# Altium schematic symbol library Capacitor - Aluminium TH.SchLib: 4591 symbols (part 1 of 27) (continued)
## 16ZLS2200MEFC12.5X20 (continued)
CAP ALUM 2200UF 20% 16V RADIAL; Part Number: 16ZLS2200MEFC12.5X20; Manufacturer: Rubycon; TemperatureRange: -40C ~ 105C; Type: Polar; Ripple Current: 1.736A; Impedance: 17 mOhm; Value: 2200uF; PartId: 23373; Supplier 1: Digi-Key; Supplier Part Number 1: 1189-2578-ND; ComponentLink1Description: Datasheet; ComponentLink1URL: http://www.rubycon.co.jp/en/catalog/e_pdfs/aluminum/e_zls.pdf; ComponentLink2Description: Digi-Key Listing; ComponentLink2URL: https://www.digikey.com/product-detail/en/rubycon/16ZLS2200MEFC12.5X20/1189-2578-ND/4977125; Tolerance: 20%; Voltage: 16V; Price: 0.9; Device Package: Radial, Can, 12.5mm
footprint CAP AL TH D12.5 L5 H22
pins: 1, 2

## 16ZLS2700MEFC12.5X25
designator C?, comment 2700uF  (value not drawn)
CAP ALUM 2700UF 20% 16V RADIAL; Part Number: 16ZLS2700MEFC12.5X25; Manufacturer: Rubycon; TemperatureRange: -40C ~ 105C; Type: Polar; Ripple Current: 2.03A; Impedance: 15 mOhm; Value: 2700uF; PartId: 23980; Supplier 1: Digi-Key; Supplier Part Number 1: 1189-2579-ND; ComponentLink1Description: Datasheet; ComponentLink1URL: http://www.rubycon.co.jp/en/catalog/e_pdfs/aluminum/e_zls.pdf; ComponentLink2Description: Digi-Key Listing; ComponentLink2URL: https://www.digikey.com/product-detail/en/rubycon/16ZLS2700MEFC12.5X25/1189-2579-ND/4977126; Tolerance: 20%; Voltage: 16V; Price: 1.03; Device Package: Radial, Can, 12.5mm
footprint CAP AL TH D12.5 L5 H27
pins: 1, 2

## 16ZLS3300MEFC12.5X30
designator C?, comment 3300uF  (value not drawn)
CAP ALUM 3300UF 20% 16V RADIAL; Part Number: 16ZLS3300MEFC12.5X30; Manufacturer: Rubycon; TemperatureRange: -40C ~ 105C; Type: Polar; Ripple Current: 2.415A; Impedance: 13 mOhm; Value: 3300uF; PartId: 24295; Supplier 1: Digi-Key; Supplier Part Number 1: 1189-2580-ND; ComponentLink1Description: Datasheet; ComponentLink1URL: http://www.rubycon.co.jp/en/catalog/e_pdfs/aluminum/e_zls.pdf; ComponentLink2Description: Digi-Key Listing; ComponentLink2URL: https://www.digikey.com/product-detail/en/rubycon/16ZLS3300MEFC12.5X30/1189-2580-ND/4977127; Tolerance: 20%; Voltage: 16V; Price: 1.16; Device Package: Radial, Can, 12.5mm
footprint CAP AL TH D12.5 L5 H35.5
pins: 1, 2

## 25PK680MEFC10X12.5
designator C?, comment 680uF  (value not drawn)
CAP ALUM 680UF 20% 25V RADIAL; Part Number: 25PK680MEFC10X12.5; Manufacturer: Rubycon; TemperatureRange: -40C ~ 85C; Ripple Current: 780mA; Value: 680uF; PartId: 24905; Supplier 1: Digi-Key; Supplier Part Number 1: 1189-1222-ND; ComponentLink1Description: Datasheet; ComponentLink1URL: http://www.rubycon.co.jp/en/catalog/e_pdfs/aluminum/e_pk.pdf; ComponentLink2Description: Digi-Key Listing; ComponentLink2URL: https://www.digikey.com/product-detail/en/rubycon/25PK680MEFC10X12.5/1189-1222-ND/3134178; Tolerance: 20%; Voltage: 25V; Price: 0.49; Device Package: Radial, Can, 10mm
footprint CAP AL TH D10 L5 H14.5
pins: 1, 2

## 25PK1000MEFC10X16
designator C?, comment 1000uF  (value not drawn)
CAP ALUM 1000UF 20% 25V RADIAL; Part Number: 25PK1000MEFC10X16; Manufacturer: Rubycon; TemperatureRange: -40C ~ 85C; Ripple Current: 870mA; Value: 1000uF; PartId: 25213; Supplier 1: Digi-Key; Supplier Part Number 1: 1189-1217-ND; ComponentLink1Description: Datasheet; ComponentLink1URL: http://www.rubycon.co.jp/en/catalog/e_pdfs/aluminum/e_pk.pdf; ComponentLink2Description: Digi-Key Listing; ComponentLink2URL: https://www.digikey.com/product-detail/en/rubycon/25PK1000MEFC10X16/1189-1217-ND/3134173; Tolerance: 20%; Voltage: 25V; Price: 0.52; Device Package: Radial, Can, 10mm
footprint CAP AL TH D10 L5 H17.5
pins: 1, 2

## 25PK2200MEFC12.5X20
designator C?, comment 2200uF  (value not drawn)
CAP ALUM 2200UF 20% 25V RADIAL; Part Number: 25PK2200MEFC12.5X20; Manufacturer: Rubycon; TemperatureRange: -40C ~ 85C; Ripple Current: 1.5A; Value: 2200uF; PartId: 22956; Supplier 1: Digi-Key; Supplier Part Number 1: 1189-1731-ND; ComponentLink1Description: Datasheet; ComponentLink1URL: http://www.rubycon.co.jp/en/catalog/e_pdfs/aluminum/e_pk.pdf; ComponentLink2Description: Digi-Key Listing; ComponentLink2URL: https://www.digikey.com/product-detail/en/rubycon/25PK2200MEFC12.5X20/1189-1731-ND/3564008; Tolerance: 20%; Voltage: 25V; Price: 0; Device Package: Radial, Can, 12.5mm
footprint CAP AL TH D12.5 L5 H21.5
pins: 1, 2

## 25PX680MEFC10X12.5
designator C?, comment 680uF  (value not drawn)
CAP ALUM 680UF 20% 25V RADIAL; Part Number: 25PX680MEFC10X12.5; Manufacturer: Rubycon; TemperatureRange: -55C ~ 105C; Type: Polar; Ripple Current: 630mA; Value: 680uF; PartId: 24799; Supplier 1: Digi-Key; Supplier Part Number 1: 1189-1229-ND; ComponentLink1Description: Datasheet; ComponentLink1URL: http://www.rubycon.co.jp/en/catalog/e_pdfs/aluminum/e_px.pdf; ComponentLink2Description: Digi-Key Listing; ComponentLink2URL: https://www.digikey.com/product-detail/en/rubycon/25PX680MEFC10X12.5/1189-1229-ND/3134185; Tolerance: 20%; Voltage: 25V; Price: 0.45; Device Package: Radial, Can, 10mm
footprint CAP AL TH D10 L5 H14.5
pins: 1, 2

## 25PX1000MEFC10X16
designator C?, comment 1000uF  (value not drawn)
CAP ALUM 1000UF 20% 25V RADIAL; Part Number: 25PX1000MEFC10X16; Manufacturer: Rubycon; TemperatureRange: -55C ~ 105C; Type: Polar; Ripple Current: 740mA @ 120Hz; Value: 1000uF; PartId: 25377; Supplier 1: Digi-Key; Supplier Part Number 1: 1189-3681-ND; ComponentLink1Description: Datasheet; ComponentLink1URL: http://www.rubycon.co.jp/en/catalog/e_pdfs/aluminum/e_px.pdf; ComponentLink2Description: Digi-Key Listing; ComponentLink2URL: https://www.digikey.com/product-detail/en/rubycon/25PX1000MEFC10X16/1189-3681-ND/3563675; Tolerance: 20%; Voltage: 25V; Price: 0.73; Device Package: Radial, Can, 10mm
footprint CAP AL TH D10 L5 H17.5
pins: 1, 2

## 25PX1000MEFCT810X16
designator C?, comment 1000uF  (value not drawn)
CAP ALUM 1000UF 20% 25V RADIAL; Part Number: 25PX1000MEFCT810X16; Manufacturer: Rubycon; TemperatureRange: -55C ~ 105C; Type: Polar; Ripple Current: 740mA; Value: 1000uF; PartId: 25044; Supplier 1: Digi-Key; Supplier Part Number 1: 1189-1583-3-ND; ComponentLink1Description: Datasheet; ComponentLink1URL: http://www.rubycon.co.jp/en/catalog/e_pdfs/aluminum/e_px.pdf; ComponentLink2Description: Digi-Key Listing; ComponentLink2URL: https://www.digikey.com/product-detail/en/rubycon/25PX1000MEFCT810X16/1189-1583-3-ND/3134863; Tolerance: 20%; Voltage: 25V; Price: 0.1922; Device Package: Radial, Can, 10mm
footprint CAP AL TH D10 L5 H17.5
pins: 1, 2

## 25PX6800MEFC16X31.5
designator C?, comment 6800uF  (value not drawn)
CAP ALUM 6800UF 20% 25V RADIAL; Part Number: 25PX6800MEFC16X31.5; Manufacturer: Rubycon; TemperatureRange: -55C ~ 105C; Type: Polar; Ripple Current: 1.91A; Value: 6800uF; PartId: 27157; Supplier 1: Digi-Key; Supplier Part Number 1: 1189-1706-ND; ComponentLink1Description: Datasheet; ComponentLink1URL: http://www.rubycon.co.jp/en/catalog/e_pdfs/aluminum/e_px.pdf; ComponentLink2Description: Digi-Key Listing; ComponentLink2URL: https://www.digikey.com/product-detail/en/rubycon/25PX6800MEFC16X31.5/1189-1706-ND/3621620; Tolerance: 20%; Voltage: 25V; Price: 1.87; Device Package: Radial, Can, 16mm
footprint CAP AL TH D16 L7.5 H33.5
pins: 1, 2

## 25WA470MEFC10X9
designator C?, comment 470uF  (value not drawn)
CAP ALUM 470UF 20% 25V RADIAL; Part Number: 25WA470MEFC10X9; Manufacturer: Rubycon; TemperatureRange: -40C ~ 85C; Ripple Current: 460mA; Value: 470uF; PartId: 24478; Supplier 1: Digi-Key; Supplier Part Number 1: 1189-2231-ND; ComponentLink1Description: Datasheet; ComponentLink1URL: http://www.rubycon.co.jp/en/catalog/e_pdfs/aluminum/e_wa.pdf; ComponentLink2Description: Digi-Key Listing; ComponentLink2URL: https://www.digikey.com/product-detail/en/rubycon/25WA470MEFC10X9/1189-2231-ND/3563512; Tolerance: 20%; Voltage: 25V; Price: 0.66; Device Package: Radial, Can, 10mm
footprint CAP AL TH D10 L5 H12.5
pins: 1, 2

## 25WXA470MEFC10X9
designator C?, comment 470uF  (value not drawn)
CAP ALUM 470UF 20% 25V RADIAL; Part Number: 25WXA470MEFC10X9; Manufacturer: Rubycon; TemperatureRange: -55C ~ 105C; Type: Polar; Ripple Current: 370mA; Value: 470uF; PartId: 24467; Supplier 1: Digi-Key; Supplier Part Number 1: 1189-2233-ND; ComponentLink1Description: Datasheet; ComponentLink1URL: http://www.rubycon.co.jp/en/catalog/e_pdfs/aluminum/e_wxa.pdf; ComponentLink2Description: Digi-Key Listing; ComponentLink2URL: https://www.digikey.com/product-detail/en/rubycon/25WXA470MEFC10X9/1189-2233-ND/3563526; Tolerance: 20%; Voltage: 25V; Price: 0.55; Device Package: Radial, Can, 10mm
footprint CAP AL TH D10 L5 H12.5
pins: 1, 2

## 25WXA1000MEFC12.5X16
designator C?, comment 1000uF  (value not drawn)
CAP ALUM 1000UF 20% 25V RADIAL; Part Number: 25WXA1000MEFC12.5X16; Manufacturer: Rubycon; TemperatureRange: -55C ~ 105C; Type: Polar; Ripple Current: 670mA; Value: 1000uF; PartId: 22801; Supplier 1: Digi-Key; Supplier Part Number 1: 1189-2232-ND; ComponentLink1Description: Datasheet; ComponentLink1URL: http://www.rubycon.co.jp/en/catalog/e_pdfs/aluminum/e_wxa.pdf; ComponentLink2Description: Digi-Key Listing; ComponentLink2URL: https://www.digikey.com/product-detail/en/rubycon/25WXA1000MEFC12.5X16/1189-2232-ND/3563953; Tolerance: 20%; Voltage: 25V; Price: 0; Device Package: Radial, Can, 12.5mm
footprint CAP AL TH D12.5 L5 H17.5
pins: 1, 2

## 25YXF470MEFC10X16
designator C?, comment 470uF  (value not drawn)
CAP ALUM 470UF 20% 25V RADIAL; Part Number: 25YXF470MEFC10X16; Manufacturer: Rubycon; TemperatureRange: -40C ~ 105C; Type: Polar; Ripple Current: 562.5mA; Impedance: 120 mOhm; Value: 470uF; PartId: 25162; Supplier 1: Digi-Key; Supplier Part Number 1: 1189-1870-ND; ComponentLink1Description: Datasheet; ComponentLink1URL: http://www.rubycon.co.jp/en/catalog/e_pdfs/aluminum/e_yxf.pdf; ComponentLink2Description: Digi-Key Listing; ComponentLink2URL: https://www.digikey.com/product-detail/en/rubycon/25YXF470MEFC10X16/1189-1870-ND/3563688; Tolerance: 20%; Voltage: 25V; Price: 0.44; Device Package: Radial, Can, 10mm
footprint CAP AL TH D10 L5 H17.5
pins: 1, 2

## 25YXF1000MEFC12.5X20
designator C?, comment 1000uF  (value not drawn)
CAP ALUM 1000UF 20% 25V RADIAL; Part Number: 25YXF1000MEFC12.5X20; Manufacturer: Rubycon; TemperatureRange: -40C ~ 105C; Type: Polar; Ripple Current: 975mA; Impedance: 62 mOhm; Value: 1000uF; PartId: 23230; Supplier 1: Digi-Key; Supplier Part Number 1: 1189-1902-ND; ComponentLink1Description: Datasheet; ComponentLink1URL: http://www.rubycon.co.jp/en/catalog/e_pdfs/aluminum/e_yxf.pdf; ComponentLink2Description: Digi-Key Listing; ComponentLink2URL: https://www.digikey.com/product-detail/en/rubycon/25YXF1000MEFC12.5X20/1189-1902-ND/3564028; Tolerance: 20%; Voltage: 25V; Price: 0.67; Device Package: Radial, Can, 12.5mm
footprint CAP AL TH D12.5 L5 H22
pins: 1, 2

## 25YXF2200MEFC16X25
designator C?, comment 2200uF  (value not drawn)
CAP ALUM 2200UF 20% 25V RADIAL; Part Number: 25YXF2200MEFC16X25; Manufacturer: Rubycon; TemperatureRange: -40C ~ 105C; Type: Polar; Ripple Current: 1.5A; Impedance: 34 mOhm; Value: 2200uF; PartId: 26893; Supplier 1: Digi-Key; Supplier Part Number 1: 1189-2234-ND; ComponentLink1Description: Datasheet; ComponentLink1URL: http://www.rubycon.co.jp/en/catalog/e_pdfs/aluminum/e_yxf.pdf; ComponentLink2Description: Digi-Key Listing; ComponentLink2URL: https://www.digikey.com/product-detail/en/rubycon/25YXF2200MEFC16X25/1189-2234-ND/3564458; Tolerance: 20%; Voltage: 25V; Price: 1.41; Device Package: Radial, Can, 16mm
footprint CAP AL TH D16 L7.5 H27
pins: 1, 2

## 25YXG330MEFC10X12.5
designator C?, comment 330uF  (value not drawn)
CAP ALUM 330UF 20% 25V RADIAL; Part Number: 25YXG330MEFC10X12.5; Manufacturer: Rubycon; TemperatureRange: -40C ~ 105C; Type: Polar; Ripple Current: 475.8mA @ 120Hz; Impedance: 80 mOhm; Value: 330uF; PartId: 24951; Supplier 1: Digi-Key; Supplier Part Number 1: 1189-2235-ND; ComponentLink1Description: Datasheet; ComponentLink1URL: http://www.rubycon.co.jp/en/catalog/e_pdfs/aluminum/e_yxg.pdf; ComponentLink2Description: Digi-Key Listing; ComponentLink2URL: https://www.digikey.com/product-detail/en/rubycon/25YXG330MEFC10X12.5/1189-2235-ND/3563589; Tolerance: 20%; Voltage: 25V; Price: 0.52; Device Package: Radial, Can, 10mm
footprint CAP AL TH D10 L5 H14.5
pins: 1, 2

## 25YXG470MEFC10X16
designator C?, comment 470uF  (value not drawn)
CAP ALUM 470UF 20% 25V RADIAL; Part Number: 25YXG470MEFC10X16; Manufacturer: Rubycon; TemperatureRange: -40C ~ 105C; Type: Polar; Ripple Current: 665.5mA @ 120Hz; Impedance: 60 mOhm; Value: 470uF; PartId: 25219; Supplier 1: Digi-Key; Supplier Part Number 1: 1189-1735-ND; ComponentLink1Description: Datasheet; ComponentLink1URL: http://www.rubycon.co.jp/en/catalog/e_pdfs/aluminum/e_yxg.pdf; ComponentLink2Description: Digi-Key Listing; ComponentLink2URL: https://www.digikey.com/product-detail/en/rubycon/25YXG470MEFC10X16/1189-1735-ND/3563695; Tolerance: 20%; Voltage: 25V; Price: 0.53; Device Package: Radial, Can, 10mm
footprint CAP AL TH D10 L5 H17.5
pins: 1, 2

## 25YXG680MEFC10X20
designator C?, comment 680uF  (value not drawn)
CAP ALUM 680UF 20% 25V RADIAL; Part Number: 25YXG680MEFC10X20; Manufacturer: Rubycon; TemperatureRange: -40C ~ 105C; Type: Polar; Ripple Current: 770mA @ 120Hz; Impedance: 46 mOhm; Value: 680uF; PartId: 25580; Supplier 1: Digi-Key; Supplier Part Number 1: 1189-1738-ND; ComponentLink1Description: Datasheet; ComponentLink1URL: http://www.rubycon.co.jp/en/catalog/e_pdfs/aluminum/e_yxg.pdf; ComponentLink2Description: Digi-Key Listing; ComponentLink2URL: https://www.digikey.com/product-detail/en/rubycon/25YXG680MEFC10X20/1189-1738-ND/3563790; Tolerance: 20%; Voltage: 25V; Price: 0.66; Device Package: Radial, Can, 10mm
footprint CAP AL TH D10 L5 H22
pins: 1, 2

## 25YXG1000MEFC12.5X20
designator C?, comment 1000uF  (value not drawn)
CAP ALUM 1000UF 20% 25V RADIAL; Part Number: 25YXG1000MEFC12.5X20; Manufacturer: Rubycon; TemperatureRange: -40C ~ 105C; Type: Polar; Ripple Current: 1.14A @ 120Hz; Impedance: 35 mOhm; Value: 1000uF; PartId: 23379; Supplier 1: Digi-Key; Supplier Part Number 1: 1189-1231-ND; ComponentLink1Description: Datasheet; ComponentLink1URL: http://www.rubycon.co.jp/en/catalog/e_pdfs/aluminum/e_yxg.pdf; ComponentLink2Description: Digi-Key Listing; ComponentLink2URL: https://www.digikey.com/product-detail/en/rubycon/25YXG1000MEFC12.5X20/1189-1231-ND/3134187; Tolerance: 20%; Voltage: 25V; Price: 0.92; Device Package: Radial, Can, 12.5mm
footprint CAP AL TH D12.5 L5 H22
pins: 1, 2

## 25YXJ470M10X12.5
designator C?, comment 470uF  (value not drawn)
CAP ALUM 470UF 20% 25V RADIAL; Part Number: 25YXJ470M10X12.5; Manufacturer: Rubycon; TemperatureRange: -40C ~ 105C; Type: Polar; Ripple Current: 865mA; Impedance: 80 mOhm; Value: 470uF; PartId: 24831; Supplier 1: Digi-Key; Supplier Part Number 1: 1189-2238-ND; ComponentLink1Description: Datasheet; ComponentLink1URL: http://www.rubycon.co.jp/en/catalog/e_pdfs/aluminum/e_yxj.pdf; ComponentLink2Description: Digi-Key Listing; ComponentLink2URL: https://www.digikey.com/product-detail/en/rubycon/25YXJ470M10X12.5/1189-2238-ND/3563596; Tolerance: 20%; Voltage: 25V; Price: 0.46; Device Package: Radial, Can, 10mm
footprint CAP AL TH D10 L5 H14.5
pins: 1, 2

## 25YXJ1000M10X20
designator C?, comment 1000uF  (value not drawn)
CAP ALUM 1000UF 20% 25V RADIAL; Part Number: 25YXJ1000M10X20; Manufacturer: Rubycon; TemperatureRange: -40C ~ 105C; Type: Polar; Ripple Current: 1.4A; Impedance: 46 mOhm; Value: 1000uF; PartId: 25851; Supplier 1: Digi-Key; Supplier Part Number 1: 1189-1241-ND; ComponentLink1Description: Datasheet; ComponentLink1URL: http://www.rubycon.co.jp/en/catalog/e_pdfs/aluminum/e_yxj.pdf; ComponentLink2Description: Digi-Key Listing; ComponentLink2URL: https://www.digikey.com/product-detail/en/rubycon/25YXJ1000M10X20/1189-1241-ND/3134197; Tolerance: 20%; Voltage: 25V; Price: 0.55; Device Package: Radial, Can, 10mm
footprint CAP AL TH D10 L5 H22
pins: 1, 2

## 25YXJ4700M16X31.5
designator C?, comment 4700uF  (value not drawn)
CAP ALUM 4700UF 20% 25V RADIAL; Part Number: 25YXJ4700M16X31.5; Manufacturer: Rubycon; TemperatureRange: -40C ~ 105C; Type: Polar; Ripple Current: 3.45A; Impedance: 19 mOhm; Value: 4700uF; PartId: 27150; Supplier 1: Digi-Key; Supplier Part Number 1: 25YXJ4700M16X31.5-ND; ComponentLink1Description: Datasheet; ComponentLink1URL: http://www.rubycon.co.jp/en/catalog/e_pdfs/aluminum/e_yxj.pdf; ComponentLink2Description: Digi-Key Listing; ComponentLink2URL: https://www.digikey.com/product-detail/en/rubycon/25YXJ4700M16X31.5/25YXJ4700M16X31.5-ND/3564542; Tolerance: 20%; Voltage: 25V; Price: 1.84; Device Package: Radial, Can, 16mm
footprint CAP AL TH D16 L7.5 H33.5
pins: 1, 2

## 25ZL330MEFC10X12.5
designator C?, comment 330uF  (value not drawn)
CAP ALUM 330UF 20% 25V RADIAL; Part Number: 25ZL330MEFC10X12.5; Manufacturer: Rubycon; TemperatureRange: -40C ~ 105C; Type: Polar; Ripple Current: 567mA; Impedance: 53 mOhm; Value: 330uF; PartId: 24927; Supplier 1: Digi-Key; Supplier Part Number 1: 1189-1739-ND; ComponentLink1Description: Datasheet; ComponentLink1URL: http://www.rubycon.co.jp/en/catalog/e_pdfs/aluminum/e_zl.pdf; ComponentLink2Description: Digi-Key Listing; ComponentLink2URL: https://www.digikey.com/product-detail/en/rubycon/25ZL330MEFC10X12.5/1189-1739-ND/3563603; Tolerance: 20%; Voltage: 25V; Price: 0.5; Device Package: Radial, Can, 10mm
footprint CAP AL TH D10 L5 H14.5
pins: 1, 2

## 25ZLH470MEFC10X12.5
designator C?, comment 470uF  (value not drawn)
CAP ALUM 470UF 20% 25V RADIAL; Part Number: 25ZLH470MEFC10X12.5; Manufacturer: Rubycon; TemperatureRange: -40C ~ 105C; Type: Polar; Ripple Current: 731.5mA; Impedance: 39 mOhm; Value: 470uF; PartId: 24756; Supplier 1: Digi-Key; Supplier Part Number 1: 1189-1869-ND; ComponentLink1Description: Datasheet; ComponentLink1URL: http://www.rubycon.co.jp/en/catalog/e_pdfs/aluminum/e_zlh.pdf; ComponentLink2Description: Digi-Key Listing; ComponentLink2URL: https://www.digikey.com/product-detail/en/rubycon/25ZLH470MEFC10X12.5/1189-1869-ND/3563614; Tolerance: 20%; Voltage: 25V; Price: 0.43; Device Package: Radial, Can, 10mm
footprint CAP AL TH D10 L5 H14.5
pins: 1, 2

## 25ZLH680MEFC10X16
designator C?, comment 680uF  (value not drawn)
CAP ALUM 680UF 20% 25V RADIAL; Part Number: 25ZLH680MEFC10X16; Manufacturer: Rubycon; TemperatureRange: -40C ~ 105C; Type: Polar; Ripple Current: 968mA; Impedance: 28 mOhm; Value: 680uF; PartId: 25227; Supplier 1: Digi-Key; Supplier Part Number 1: 1189-1855-ND; ComponentLink1Description: Datasheet; ComponentLink1URL: http://www.rubycon.co.jp/en/catalog/e_pdfs/aluminum/e_zlh.pdf; ComponentLink2Description: Digi-Key Listing; ComponentLink2URL: https://www.digikey.com/product-detail/en/rubycon/25ZLH680MEFC10X16/1189-1855-ND/3563722; Tolerance: 20%; Voltage: 25V; Price: 0.55; Device Package: Radial, Can, 10mm
footprint CAP AL TH D10 L5 H17.5
pins: 1, 2

## 25ZLH820MEFC10X20
designator C?, comment 820uF  (value not drawn)
CAP ALUM 820UF 20% 25V RADIAL; Part Number: 25ZLH820MEFC10X20; Manufacturer: Rubycon; TemperatureRange: -40C ~ 105C; Type: Polar; Ripple Current: 1.176A; Impedance: 20 mOhm; Value: 820uF; PartId: 25878; Supplier 1: Digi-Key; Supplier Part Number 1: 1189-2915-ND; ComponentLink1Description: Datasheet; ComponentLink1URL: http://www.rubycon.co.jp/en/catalog/e_pdfs/aluminum/e_zlh.pdf; ComponentLink2Description: Digi-Key Listing; ComponentLink2URL: https://www.digikey.com/product-detail/en/rubycon/25ZLH820MEFC10X20/1189-2915-ND/3563817; Tolerance: 20%; Voltage: 25V; Price: 0.64; Device Package: Radial, Can, 10mm
footprint CAP AL TH D10 L5 H22
pins: 1, 2

## 25ZLH1000MEFC10X20
designator C?, comment 1000uF  (value not drawn)
CAP ALUM 1000UF 20% 25V RADIAL; Part Number: 25ZLH1000MEFC10X20; Manufacturer: Rubycon; TemperatureRange: -40C ~ 105C; Type: Polar; Value: 1000uF; PartId: 25890; Supplier 1: Digi-Key; Supplier Part Number 1: 1189-1242-ND; ComponentLink1Description: Datasheet; ComponentLink1URL: http://www.rubycon.co.jp/en/catalog/e_pdfs/aluminum/e_zlh.pdf; ComponentLink2Description: Digi-Key Listing; ComponentLink2URL: https://www.digikey.com/product-detail/en/rubycon/25ZLH1000MEFC10X20/1189-1242-ND/3134198; Tolerance: 20%; Voltage: 25V; Price: 0.65; Device Package: Radial, Can, 10mm
footprint CAP AL TH D10 L5 H22
pins: 1, 2

## 25ZLH1500MEFC12.5X20
designator C?, comment 1500uF  (value not drawn)
CAP ALUM 1500UF 20% 25V RADIAL; Part Number: 25ZLH1500MEFC12.5X20; Manufacturer: Rubycon; TemperatureRange: -40C ~ 105C; Type: Polar; Ripple Current: 1.488A; Impedance: 17 mOhm; Value: 1500uF; PartId: 23438; Supplier 1: Digi-Key; Supplier Part Number 1: 1189-2241-ND; ComponentLink1Description: Datasheet; ComponentLink1URL: http://www.rubycon.co.jp/en/catalog/e_pdfs/aluminum/e_zlh.pdf; ComponentLink2Description: Digi-Key Listing; ComponentLink2URL: https://www.digikey.com/product-detail/en/rubycon/25ZLH1500MEFC12.5X20/1189-2241-ND/3564066; Tolerance: 20%; Voltage: 25V; Price: 1.03; Device Package: Radial, Can, 12.5mm
footprint CAP AL TH D12.5 L5 H22
pins: 1, 2

## 25ZLH1800MEFC12.5X25
designator C?, comment 1800uF  (value not drawn)
CAP ALUM 1800UF 20% 25V RADIAL; Part Number: 25ZLH1800MEFC12.5X25; Manufacturer: Rubycon; TemperatureRange: -40C ~ 105C; Type: Polar; Ripple Current: 1.74A; Impedance: 15 mOhm; Value: 1800uF; PartId: 24003; Supplier 1: Digi-Key; Supplier Part Number 1: 1189-2961-ND; ComponentLink1Description: Datasheet; ComponentLink1URL: http://www.rubycon.co.jp/en/catalog/e_pdfs/aluminum/e_zlh.pdf; ComponentLink2Description: Digi-Key Listing; ComponentLink2URL: https://www.digikey.com/product-detail/en/rubycon/25ZLH1800MEFC12.5X25/1189-2961-ND/3564151; Tolerance: 20%; Voltage: 25V; Price: 1.05; Device Package: Radial, Can, 12.5mm
footprint CAP AL TH D12.5 L5 H27
pins: 1, 2

## 25ZLH2200MEFC12.5X30
designator C?, comment 2200uF  (value not drawn)
CAP ALUM 2200UF 20% 25V RADIAL; Part Number: 25ZLH2200MEFC12.5X30; Manufacturer: Rubycon; TemperatureRange: -40C ~ 105C; Type: Polar; Ripple Current: 2.415A; Impedance: 13 mOhm; Value: 2200uF; PartId: 24226; Supplier 1: Digi-Key; Supplier Part Number 1: 1189-1741-ND; ComponentLink1Description: Datasheet; ComponentLink1URL: http://www.rubycon.co.jp/en/catalog/e_pdfs/aluminum/e_zlh.pdf; ComponentLink2Description: Digi-Key Listing; ComponentLink2URL: https://www.digikey.com/product-detail/en/rubycon/25ZLH2200MEFC12.5X30/1189-1741-ND/3564206; Tolerance: 20%; Voltage: 25V; Price: 0.97; Device Package: Radial, Can, 12.5mm
footprint CAP AL TH D12.5 L5 H35.5
pins: 1, 2

## 25ZLH3300MEFC16X25
designator C?, comment 3300uF  (value not drawn)
CAP ALUM 3300UF 20% 25V RADIAL; Part Number: 25ZLH3300MEFC16X25; Manufacturer: Rubycon; TemperatureRange: -40C ~ 105C; Type: Polar; Ripple Current: 2.541A; Impedance: 13 mOhm; Value: 3300uF; PartId: 26914; Supplier 1: Digi-Key; Supplier Part Number 1: 1189-2964-ND; ComponentLink1Description: Datasheet; ComponentLink1URL: http://www.rubycon.co.jp/en/catalog/e_pdfs/aluminum/e_zlh.pdf; ComponentLink2Description: Digi-Key Listing; ComponentLink2URL: https://www.digikey.com/product-detail/en/rubycon/25ZLH3300MEFC16X25/1189-2964-ND/3564492; Tolerance: 20%; Voltage: 25V; Price: 1.64; Device Package: Radial, Can, 16mm
footprint CAP AL TH D16 L7.5 H27
pins: 1, 2

## 25ZLJ470M10X12.5
designator C?, comment 470uF  (value not drawn)
CAP ALUM 470UF 20% 25V RADIAL; Part Number: 25ZLJ470M10X12.5; Manufacturer: Rubycon; TemperatureRange: -40C ~ 105C; Type: Polar; Ripple Current: 935mA @ 120Hz; Impedance: 53 mOhm; Value: 470uF; PartId: 24961; Supplier 1: Digi-Key; Supplier Part Number 1: 1189-1253-ND; ComponentLink1Description: Datasheet; ComponentLink1URL: http://www.rubycon.co.jp/en/catalog/e_pdfs/aluminum/e_zlj.pdf; ComponentLink2Description: Digi-Key Listing; ComponentLink2URL: https://www.digikey.com/product-detail/en/rubycon/25ZLJ470M10X12.5/1189-1253-ND/3134209; Tolerance: 20%; Voltage: 25V; Price: 0.53; Device Package: Radial, Can, 10mm
footprint CAP AL TH D10 L5 H14.5
pins: 1, 2

## 25ZLJ1000M10X20
designator C?, comment 1000uF  (value not drawn)
CAP ALUM 1000UF 20% 25V RADIAL; Part Number: 25ZLJ1000M10X20; Manufacturer: Rubycon; TemperatureRange: -40C ~ 105C; Type: Polar; Ripple Current: 1.5A @ 120Hz; Impedance: 28 mOhm; Value: 1000uF; PartId: 25917; Supplier 1: Digi-Key; Supplier Part Number 1: 1189-1245-ND; ComponentLink1Description: Datasheet; ComponentLink1URL: http://www.rubycon.co.jp/en/catalog/e_pdfs/aluminum/e_zlj.pdf; ComponentLink2Description: Digi-Key Listing; ComponentLink2URL: https://www.digikey.com/product-detail/en/rubycon/25ZLJ1000M10X20/1189-1245-ND/3134201; Tolerance: 20%; Voltage: 25V; Price: 0.71; Device Package: Radial, Can, 10mm
footprint CAP AL TH D10 L5 H22
pins: 1, 2

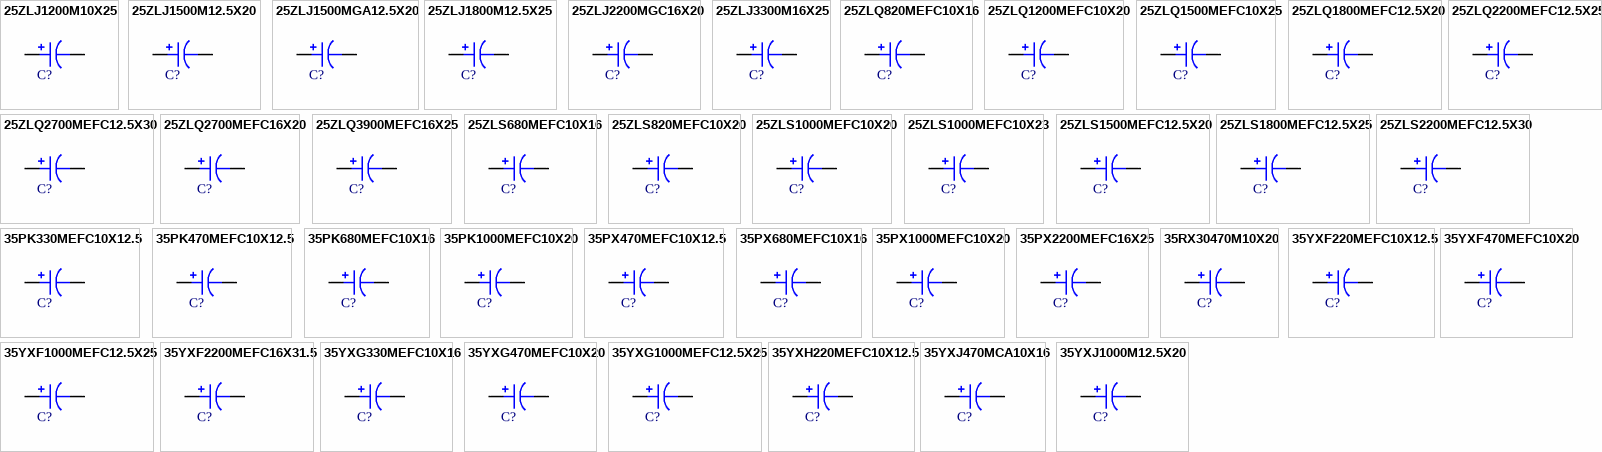
[diagram p4: symbols 25ZLJ1200M10X25 to 35YXJ1000M12.5X20]

## 25ZLJ1200M10X25
designator C?, comment 1200uF  (value not drawn)
CAP ALUM 1200UF 20% 25V RADIAL; Part Number: 25ZLJ1200M10X25; Manufacturer: Rubycon; TemperatureRange: -40C ~ 105C; Type: Polar; Ripple Current: 1.74A @ 120Hz; Impedance: 24 mOhm; Value: 1200uF; PartId: 26165; Supplier 1: Digi-Key; Supplier Part Number 1: 1189-1246-ND; ComponentLink1Description: Datasheet; ComponentLink1URL: http://www.rubycon.co.jp/en/catalog/e_pdfs/aluminum/e_zlj.pdf; ComponentLink2Description: Digi-Key Listing; ComponentLink2URL: https://www.digikey.com/product-detail/en/rubycon/25ZLJ1200M10X25/1189-1246-ND/3134202; Tolerance: 20%; Voltage: 25V; Price: 0.87; Device Package: Radial, Can, 10mm
footprint CAP AL TH D10 L5 H30
pins: 1, 2

## 25ZLJ1500M12.5X20
designator C?, comment 1500uF  (value not drawn)
CAP ALUM 1500UF 20% 25V RADIAL; Part Number: 25ZLJ1500M12.5X20; Manufacturer: Rubycon; TemperatureRange: -40C ~ 105C; Type: Polar; Ripple Current: 1.56A @ 120Hz; Impedance: 25 mOhm; Value: 1500uF; PartId: 23471; Supplier 1: Digi-Key; Supplier Part Number 1: 1189-2916-ND; ComponentLink1Description: Datasheet; ComponentLink1URL: http://www.rubycon.co.jp/en/catalog/e_pdfs/aluminum/e_zlj.pdf; ComponentLink2Description: Digi-Key Listing; ComponentLink2URL: https://www.digikey.com/product-detail/en/rubycon/25ZLJ1500M12.5X20/1189-2916-ND/3564073; Tolerance: 20%; Voltage: 25V; Price: 1.09; Device Package: Radial, Can, 12.5mm
footprint CAP AL TH D12.5 L5 H22
pins: 1, 2

## 25ZLJ1500MGA12.5X20
designator C?, comment 1500uF  (value not drawn)
CAP ALUM 1500UF 20% 25V RADIAL; Part Number: 25ZLJ1500MGA12.5X20; Manufacturer: Rubycon; TemperatureRange: -40C ~ 105C; Type: Polar; Ripple Current: 1.56A @ 120Hz; Impedance: 25 mOhm; Value: 1500uF; PartId: 23203; Supplier 1: Digi-Key; Supplier Part Number 1: 1189-1592-3-ND; ComponentLink1Description: Datasheet; ComponentLink1URL: http://www.rubycon.co.jp/en/catalog/e_pdfs/aluminum/e_zlj.pdf; ComponentLink2Description: Digi-Key Listing; ComponentLink2URL: https://www.digikey.com/product-detail/en/rubycon/25ZLJ1500MGA12.5X20/1189-1592-3-ND/3134872; Tolerance: 20%; Voltage: 25V; Price: 0.4666; Device Package: Radial, Can, 12.5mm
footprint CAP AL TH D12.5 L5 H22
pins: 1, 2

## 25ZLJ1800M12.5X25
designator C?, comment 1800uF  (value not drawn)
CAP ALUM 1800UF 20% 25V RADIAL; Part Number: 25ZLJ1800M12.5X25; Manufacturer: Rubycon; TemperatureRange: -40C ~ 105C; Type: Polar; Ripple Current: 1.92A @ 120Hz; Impedance: 19 mOhm; Value: 1800uF; PartId: 24107; Supplier 1: Digi-Key; Supplier Part Number 1: 1189-1248-ND; ComponentLink1Description: Datasheet; ComponentLink1URL: http://www.rubycon.co.jp/en/catalog/e_pdfs/aluminum/e_zlj.pdf; ComponentLink2Description: Digi-Key Listing; ComponentLink2URL: https://www.digikey.com/product-detail/en/rubycon/25ZLJ1800M12.5X25/1189-1248-ND/3134204; Tolerance: 20%; Voltage: 25V; Price: 1.35; Device Package: Radial, Can, 12.5mm
footprint CAP AL TH D12.5 L5 H27
pins: 1, 2

## 25ZLJ2200MGC16X20
designator C?, comment 2200uF  (value not drawn)
CAP ALUM 2200UF 20% 25V RADIAL; Part Number: 25ZLJ2200MGC16X20; Manufacturer: Rubycon; TemperatureRange: -40C ~ 105C; Type: Polar; Ripple Current: 2.331A @ 120Hz; Impedance: 21 mOhm; Value: 2200uF; PartId: 26391; Supplier 1: Digi-Key; Supplier Part Number 1: 1189-1593-2-ND; ComponentLink1Description: Datasheet; ComponentLink1URL: http://www.rubycon.co.jp/en/catalog/e_pdfs/aluminum/e_zlj.pdf; ComponentLink2Description: Digi-Key Listing; ComponentLink2URL: https://www.digikey.com/product-detail/en/rubycon/25ZLJ2200MGC16X20/1189-1593-2-ND/3134873; Tolerance: 20%; Voltage: 25V; Price: 0.8384; Device Package: Radial, Can, 16mm
footprint CAP AL TH D16 L7.5 H22
pins: 1, 2

## 25ZLJ3300M16X25
designator C?, comment 3300uF  (value not drawn)
CAP ALUM 3300UF 20% 25V RADIAL; Part Number: 25ZLJ3300M16X25; Manufacturer: Rubycon; TemperatureRange: -40C ~ 105C; Type: Polar; Ripple Current: 2.667A @ 120Hz; Impedance: 17 mOhm; Value: 3300uF; PartId: 26926; Supplier 1: Digi-Key; Supplier Part Number 1: 1189-1250-ND; ComponentLink1Description: Datasheet; ComponentLink1URL: http://www.rubycon.co.jp/en/catalog/e_pdfs/aluminum/e_zlj.pdf; ComponentLink2Description: Digi-Key Listing; ComponentLink2URL: https://www.digikey.com/product-detail/en/rubycon/25ZLJ3300M16X25/1189-1250-ND/3134206; Tolerance: 20%; Voltage: 25V; Price: 1.76; Device Package: Radial, Can, 16mm
footprint CAP AL TH D16 L7.5 H27
pins: 1, 2

## 25ZLQ820MEFC10X16
designator C?, comment 820uF  (value not drawn)
CAP ALUM 820UF 20% 25V T/H; Part Number: 25ZLQ820MEFC10X16; Manufacturer: Rubycon; TemperatureRange: -40C ~ 105C; Type: Polar; Ripple Current: 1.158A @ 120Hz; Impedance: 25 mOhm; Value: 820uF; PartId: 25448; Supplier 1: Digi-Key; Supplier Part Number 1: 1189-3647-ND; ComponentLink1Description: Datasheet; ComponentLink1URL: http://www.rubycon.co.jp/en/catalog/e_pdfs/aluminum/e_ZLQ.pdf; ComponentLink2Description: Digi-Key Listing; ComponentLink2URL: https://www.digikey.com/product-detail/en/rubycon/25ZLQ820MEFC10X16/1189-3647-ND/6049874; Tolerance: 20%; Voltage: 25V; Price: 0.69; Device Package: Radial, Can, 10mm
footprint CAP AL TH D10 L5 H17.5
pins: 1, 2

## 25ZLQ1200MEFC10X20
designator C?, comment 1200uF  (value not drawn)
CAP ALUM 1200UF 20% 25V T/H; Part Number: 25ZLQ1200MEFC10X20; Manufacturer: Rubycon; TemperatureRange: -40C ~ 105C; Type: Polar; Ripple Current: 1.278A @ 120Hz; Impedance: 18 mOhm; Value: 1200uF; PartId: 25920; Supplier 1: Digi-Key; Supplier Part Number 1: 1189-3648-ND; ComponentLink1Description: Datasheet; ComponentLink1URL: http://www.rubycon.co.jp/en/catalog/e_pdfs/aluminum/e_ZLQ.pdf; ComponentLink2Description: Digi-Key Listing; ComponentLink2URL: https://www.digikey.com/product-detail/en/rubycon/25ZLQ1200MEFC10X20/1189-3648-ND/6049875; Tolerance: 20%; Voltage: 25V; Price: 0.71; Device Package: Radial, Can, 10mm
footprint CAP AL TH D10 L5 H22
pins: 1, 2

## 25ZLQ1500MEFC10X25
designator C?, comment 1500uF  (value not drawn)
CAP ALUM 1500UF 20% 25V T/H; Part Number: 25ZLQ1500MEFC10X25; Manufacturer: Rubycon; TemperatureRange: -40C ~ 105C; Type: Polar; Ripple Current: 1.5A @ 120Hz; Impedance: 15 mOhm; Value: 1500uF; PartId: 26130; Supplier 1: Digi-Key; Supplier Part Number 1: 1189-3649-ND; ComponentLink1Description: Datasheet; ComponentLink1URL: http://www.rubycon.co.jp/en/catalog/e_pdfs/aluminum/e_ZLQ.pdf; ComponentLink2Description: Digi-Key Listing; ComponentLink2URL: https://www.digikey.com/product-detail/en/rubycon/25ZLQ1500MEFC10X25/1189-3649-ND/6050008; Tolerance: 20%; Voltage: 25V; Price: 0.8; Device Package: Radial, Can, 10mm
footprint CAP AL TH D10 L5 H30
pins: 1, 2

## 25ZLQ1800MEFC12.5X20
designator C?, comment 1800uF  (value not drawn)
CAP ALUM 1800UF 20% 25V T/H; Part Number: 25ZLQ1800MEFC12.5X20; Manufacturer: Rubycon; TemperatureRange: -40C ~ 105C; Type: Polar; Ripple Current: 1.614A @ 120Hz; Impedance: 16 mOhm; Value: 1800uF; PartId: 23439; Supplier 1: Digi-Key; Supplier Part Number 1: 1189-3650-ND; ComponentLink1Description: Datasheet; ComponentLink1URL: http://www.rubycon.co.jp/en/catalog/e_pdfs/aluminum/e_ZLQ.pdf; ComponentLink2Description: Digi-Key Listing; ComponentLink2URL: https://www.digikey.com/product-detail/en/rubycon/25ZLQ1800MEFC12.5X20/1189-3650-ND/6050009; Tolerance: 20%; Voltage: 25V; Price: 1.03; Device Package: Radial, Can, 12.5mm
footprint CAP AL TH D12.5 L5 H22
pins: 1, 2

## 25ZLQ2200MEFC12.5X25
designator C?, comment 2200uF  (value not drawn)
CAP ALUM 2200UF 20% 25V T/H; Part Number: 25ZLQ2200MEFC12.5X25; Manufacturer: Rubycon; TemperatureRange: -40C ~ 105C; Type: Polar; Ripple Current: 2.198A @ 120Hz; Impedance: 13 mOhm; Value: 2200uF; PartId: 24004; Supplier 1: Digi-Key; Supplier Part Number 1: 1189-3651-ND; ComponentLink1Description: Datasheet; ComponentLink1URL: http://www.rubycon.co.jp/en/catalog/e_pdfs/aluminum/e_ZLQ.pdf; ComponentLink2Description: Digi-Key Listing; ComponentLink2URL: https://www.digikey.com/product-detail/en/rubycon/25ZLQ2200MEFC12.5X25/1189-3651-ND/6050010; Tolerance: 20%; Voltage: 25V; Price: 1.05; Device Package: Radial, Can, 12.5mm
footprint CAP AL TH D12.5 L5 H27
pins: 1, 2